# Altium footprint library Wurth_Elektronik_Electromechanic_Wire_to_Board_Connectors_rev16a.PCBLIB: 662 footprints (part 17 of 42)
Each footprint in its own frame and in the unit in brackets; x right, y up, seen from the top. Pads: shape width x height; smd on the part's side, far side on the other; paste and mask are expansions set on the pad; w line width, h text height; cw(c..) or ccw(c..) is an arc to the next point about the centre after c.
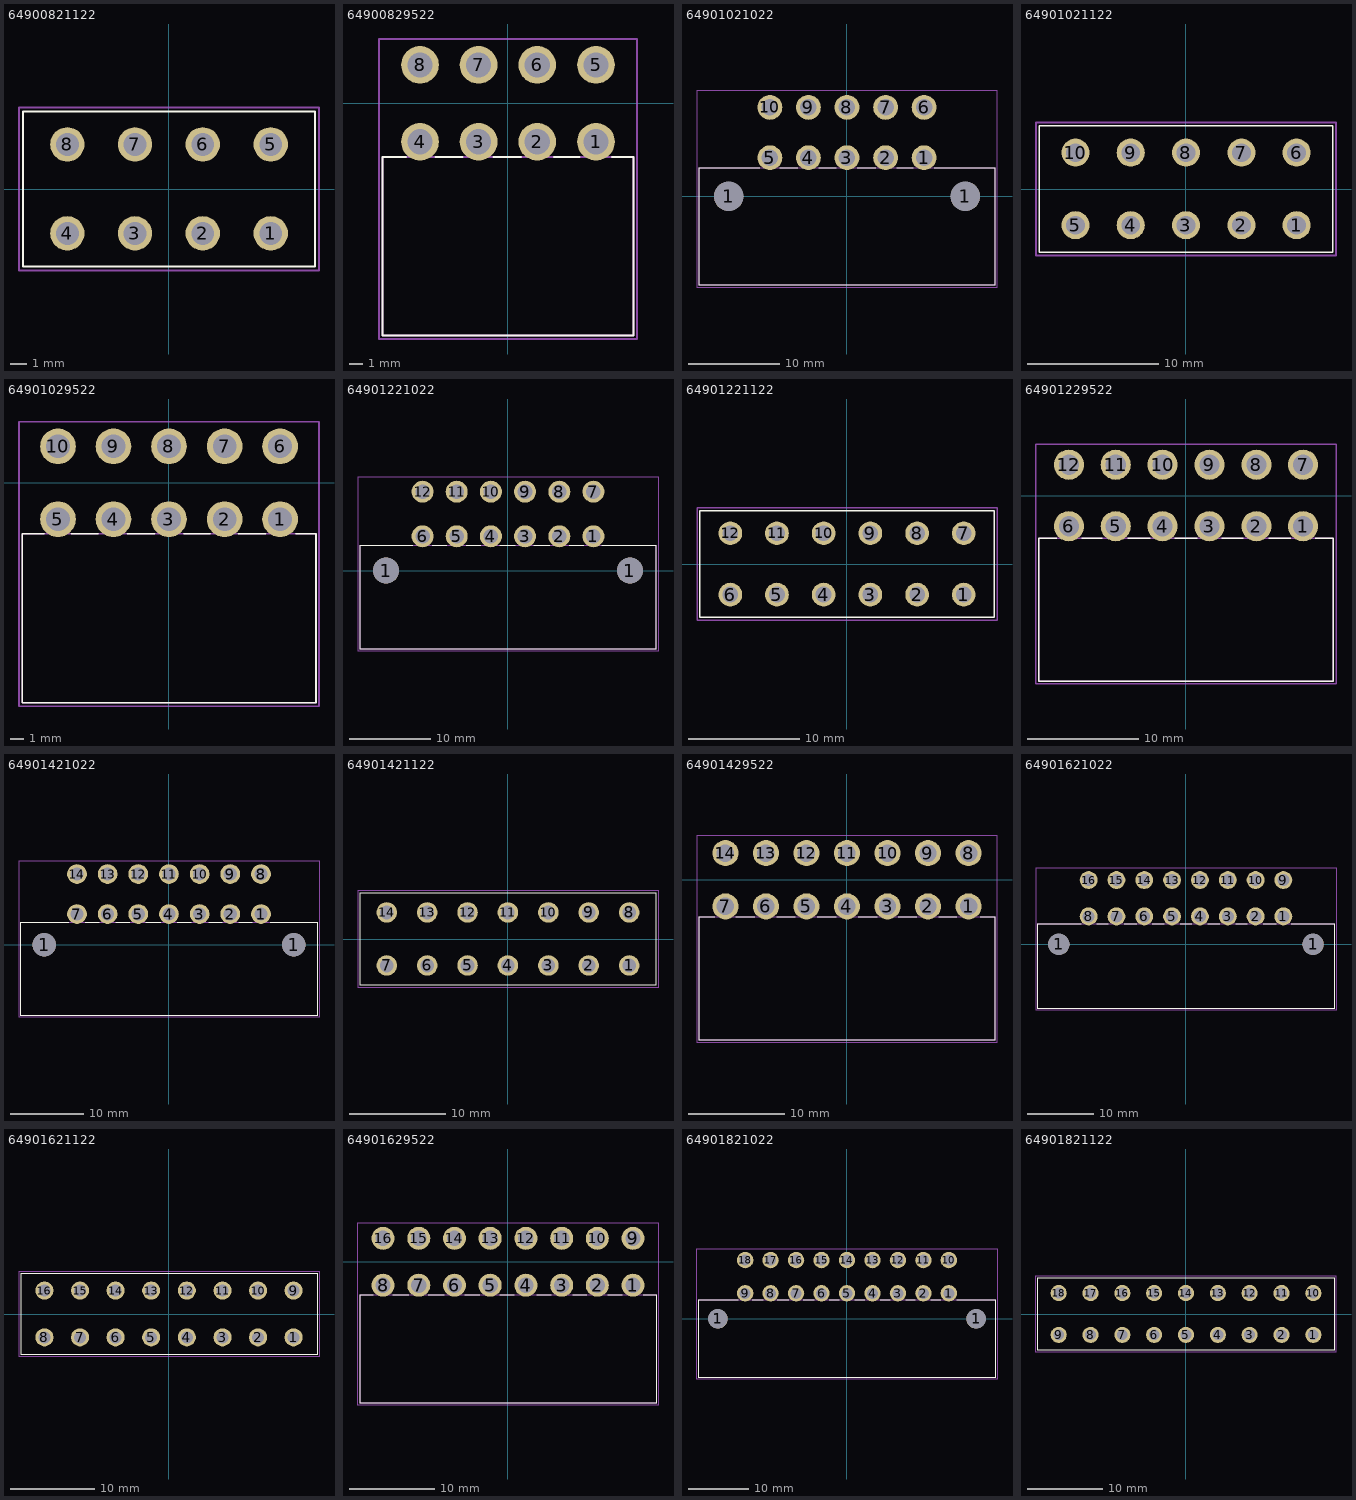
[diagram p16: the footprints below, top view; thin cyan lines are the x and y axes]

## 64900821122 [mil]
pads (8):
  round 84 hole 56: 1(249,-108.27) 2(83,-108.27) 3(-82.68,-108.27) 4(-248.03,-108.27) 5(249,109) 6(83,109) 7(-82.68,109) 8(-248.03,109)
Top Overlay:
  lines w5: -356.3,-188.98 357,-188.98 357,189 -356.3,189 -356.3,-188.98
Mechanical 2:
  text ">NAME" at -108.27,237 h77.5
Mechanical 4:
  text ">VALUE" at -127.95,-285.43 h77.5
Mechanical 16:
  text "1" at 224,-125 h77.5
  text "8" at -267.32,85 h77.5
Mechanical 27:
  lines w5: -366.14,-198.82 367,-198.82 367,199 -366.14,199 -366.14,-198.82

## 64900829522 [mil]
pads (8):
  round 106.5 hole 71: 1(249,-108.27) 2(83,-108.27) 3(-82.68,-108.27) 4(-248.03,-108.27) 5(249,109) 6(83,109) 7(-82.68,109) 8(-248.03,109)
Top Overlay:
  lines w5: -287.4,-151.57 -354.33,-151.57 -354.33,-655.51 355,-655.51 355,-153.54 355,-151.57 294,-151.57 ; -204.72,-151.57 -127.95,-151.57 ; -41.34,-151.57 38,-151.57 ; 130,-151.57 203,-151.57
Mechanical 2:
  text ">NAME" at -638.68,-358.86 h77.5
Mechanical 4:
  text ">VALUE" at -663.68,-438.29 h77.5
Mechanical 16:
  lines w5: -354.33,-655.51 355,-655.51 355,-151.57 -354.33,-151.57 -354.33,-655.51
  text "8" at -260.24,75 h77.5
  text "1" at 247,-133.86 h77.5
Mechanical 27:
  lines w5: -364.17,-665.35 365,-665.35 365,182 -364.17,182 -364.17,-665.35

## 64901021022 [mil]
pads (12):
  round 126 hole 126: 1(-507.87,0) 1(508,0)
  round 106.5 hole 71: 1(331,166) 2(166,166) 3(0,166) 4(-165.35,166) 5(-330.71,166) 6(331,382) 7(166,382) 8(0,382) 9(-165.35,382) 10(-330.71,382)
Top Overlay:
  lines w5: -374.02,123 -633.86,123 -633.86,-381.89 634,-381.89 634,123 375,123 ; -289.37,123 -210.63,123 ; -122.05,123 -45.28,123 ; 44,123 121,123 121,121 ; 213,123 284,123
Mechanical 2:
  text ">NAME" at -921.36,-110.24 h77.5
Mechanical 4:
  text ">VALUE" at -946.36,-189.67 h77.5
Mechanical 16:
  lines w5: -633.86,-381.89 634,-381.89 634,123 -633.86,123 -633.86,-381.89
  text "1" at 365,121 h77.5
  text "10" at -377.56,349 h77.5
Mechanical 27:
  lines w5: -643.7,-391.73 644,-391.73 644,455 -643.7,455 -643.7,-391.73

## 64901021122 [mil]
pads (10):
  round 84 hole 56: 1(331,-108.27) 2(166,-108.27) 3(0,-108.27) 4(-165.35,-108.27) 5(-330.71,-108.27) 6(331,109) 7(166,109) 8(0,109) 9(-165.35,109) 10(-330.71,109)
Top Overlay:
  lines w5: -438.98,-188.98 439,-188.98 439,189 -438.98,189 -438.98,-188.98
Mechanical 2:
  text ">NAME" at -108.27,237 h77.5
Mechanical 4:
  text ">VALUE" at -127.95,-285.43 h77.5
Mechanical 16:
  text "1" at 306,-125 h77.5
  text "10" at -384.65,85 h77.5
Mechanical 27:
  lines w5: -448.82,-198.82 449,-198.82 449,199 -448.82,199 -448.82,-198.82

## 64901029522 [mil]
pads (10):
  round 106.5 hole 71: 1(331,-108.27) 2(166,-108.27) 3(0,-108.27) 4(-165.35,-108.27) 5(-330.71,-108.27) 6(331,109) 7(166,109) 8(0,109) 9(-165.35,109) 10(-330.71,109)
Top Overlay:
  lines w5: -372.05,-151.57 -437.01,-151.57 -437.01,-655.51 438,-655.51 438,-151.57 ; -291.34,-151.57 -210.63,-151.57 ; -124.02,-151.57 -43.31,-151.57 ; 44,-151.57 123,-151.57 ; 207,-151.57 288,-151.57 ; 378,-151.57 436,-151.57
Mechanical 2:
  text ">NAME" at -721.36,-358.86 h77.5
Mechanical 4:
  text ">VALUE" at -746.36,-438.29 h77.5
Mechanical 16:
  lines w5: -437.01,-655.51 438,-655.51 438,-151.57 -437.01,-151.57 -437.01,-655.51
  text "10" at -377.56,75 h77.5
  text "1" at 322,-133.86 h77.5
Mechanical 27:
  lines w5: -446.85,-665.35 447,-665.35 447,182 -446.85,182 -446.85,-665.35

## 64901221022 [mil]
pads (14):
  round 126 hole 126: 1(-590.55,0) 1(591,0)
  round 106.5 hole 71: 1(414,166) 2(249,166) 3(83,166) 4(-82.68,166) 5(-248.03,166) 6(-413.39,166) 7(414,382) 8(249,382) 9(83,382) 10(-82.68,382) 11(-248.03,382) 12(-413.39,382)
Top Overlay:
  lines w5: -460.63,123 -716.54,123 -716.54,-381.89 717,-381.89 717,123 455,123 ; -366.14,123 -295.28,123 ; -202.76,123 -131.89,123 ; -39.37,123 36,123 ; 126,123 203,123 ; 296,123 367,123
Mechanical 2:
  text ">NAME" at -1051.08,-109.65 h77.5
Mechanical 4:
  text ">VALUE" at -1055.02,-194.98 h77.5
Mechanical 16:
  lines w5: -716.54,-381.89 717,-381.89 717,123 -716.54,123 -716.54,-381.89
  text "1" at 389,24 h77.5
  text "12" at -444.88,349 h77.5
Mechanical 27:
  lines w5: -726.38,-391.73 727,-391.73 727,455 -726.38,455 -726.38,-391.73

## 64901221122 [mil]
pads (12):
  round 84 hole 56: 1(414,-108.27) 2(249,-108.27) 3(83,-108.27) 4(-82.68,-108.27) 5(-248.03,-108.27) 6(-413.39,-108.27) 7(414,109) 8(249,109) 9(83,109) 10(-82.68,109) 11(-248.03,109) 12(-413.39,109)
Top Overlay:
  lines w5: -521.65,-188.98 522,-188.98 522,189 -521.65,189 -521.65,-188.98
Mechanical 2:
  text ">NAME" at -108.27,237 h77.5
Mechanical 4:
  text ">VALUE" at -127.95,-285.43 h77.5
Mechanical 16:
  text "1" at 389,-125 h77.5
  text "12" at -451.97,85 h77.5
Mechanical 27:
  lines w5: -531.5,-198.82 532,-198.82 532,199 -531.5,199 -531.5,-198.82

## 64901229522 [mil]
pads (12):
  round 106.5 hole 71: 1(414,-108.27) 2(249,-108.27) 3(83,-108.27) 4(-82.68,-108.27) 5(-248.03,-108.27) 6(-413.39,-108.27) 7(414,109) 8(249,109) 9(83,109) 10(-82.68,109) 11(-248.03,109) 12(-413.39,109)
Top Overlay:
  lines w5: -456.69,-151.57 -519.68,-151.57 -519.68,-655.51 520,-655.51 520,-151.57 457,-151.57 ; -368.11,-151.57 -295.28,-151.57 ; -204.72,-151.57 -125.98,-151.57 ; -39.37,-151.57 40,-151.57 ; 126,-151.57 203,-151.57 ; 292,-151.57 371,-151.57
Mechanical 2:
  text ">NAME" at -813.68,-383.86 h77.5
Mechanical 4:
  text ">VALUE" at -838.68,-463.29 h77.5
Mechanical 16:
  lines w5: -519.68,-655.51 520,-655.51 520,-151.57 -519.68,-151.57 -519.68,-655.51
  text "12" at -444.88,75 h77.5
  text "1" at 405,-133.86 h77.5
Mechanical 27:
  lines w5: -529.53,-665.35 530,-665.35 530,182 -529.53,182 -529.53,-665.35

## 64901421022 [mil]
pads (16):
  round 126 hole 126: 1(-673.23,0) 1(674,0)
  round 106.5 hole 71: 1(497,166) 2(331,166) 3(166,166) 4(0,166) 5(-165.35,166) 6(-330.71,166) 7(-496.06,166) 8(497,382) 9(331,382) 10(166,382) 11(0,382) 12(-165.35,382) 13(-330.71,382) 14(-496.06,382)
Top Overlay:
  lines w5: -539.37,123 -799.21,123 -799.21,-381.89 800,-381.89 800,123 546,123 ; -452.76,123 -375.98,123 ; -287.4,123 -212.6,123 ; -125.98,123 -43.31,123 ; 46,123 121,123 ; 215,123 288,123 ; 376,123 449,123
Mechanical 2:
  text ">NAME" at -1106,-135.24 h77.5
Mechanical 4:
  text ">VALUE" at -1106,-214.67 h77.5
Mechanical 16:
  lines w5: -799.21,-381.89 800,-381.89 800,123 -799.21,123 -799.21,-381.89
  text "14" at -537.2,349 h77.5
  text "1" at 472,24 h77.5
Mechanical 27:
  lines w5: -809.06,-391.73 810,-391.73 810,455 -809.06,455 -809.06,-391.73

## 64901421122 [mil]
pads (14):
  round 84 hole 56: 1(497,-108.27) 2(331,-108.27) 3(166,-108.27) 4(0,-108.27) 5(-165.35,-108.27) 6(-330.71,-108.27) 7(-496.06,-108.27) 8(497,109) 9(331,109) 10(166,109) 11(0,109) 12(-165.35,109) 13(-330.71,109) 14(-496.06,109)
Top Overlay:
  lines w5: -604.33,-188.98 605,-188.98 605,189 -604.33,189 -604.33,-188.98
Mechanical 2:
  text ">NAME" at -108.27,237 h77.5
Mechanical 4:
  text ">VALUE" at -127.95,-285.43 h77.5
Mechanical 16:
  text "1" at 472,-125 h77.5
  text "14" at -544.29,85 h77.5
Mechanical 27:
  lines w5: -614.17,-198.82 615,-198.82 615,199 -614.17,199 -614.17,-198.82

## 64901429522 [mil]
pads (14):
  round 106.5 hole 71: 1(497,-108.27) 2(331,-108.27) 3(166,-108.27) 4(0,-108.27) 5(-165.35,-108.27) 6(-330.71,-108.27) 7(-496.06,-108.27) 8(497,109) 9(331,109) 10(166,109) 11(0,109) 12(-165.35,109) 13(-330.71,109) 14(-496.06,109)
Top Overlay:
  lines w5: -539.37,-151.57 -602.36,-151.57 -602.36,-655.51 603,-655.51 603,-153.54 603,-151.57 544,-151.57 ; -454.72,-151.57 -375.98,-151.57 ; -287.4,-151.57 -210.63,-151.57 ; -122.05,-151.57 -43.31,-151.57 ; 46,-151.57 123,-151.57 ; 209,-151.57 286,-151.57 ; 375,-151.57 449,-151.57
Mechanical 2:
  text ">NAME" at -881,-408.86 h77.5
Mechanical 4:
  text ">VALUE" at -906,-488.29 h77.5
Mechanical 16:
  lines w5: -602.36,-655.51 603,-655.51 603,-151.57 -602.36,-151.57 -602.36,-655.51
  text "14" at -537.2,75 h77.5
  text "1" at 487,-133.86 h77.5
Mechanical 27:
  lines w5: -612.2,-665.35 613,-665.35 613,182 -612.2,182 -612.2,-665.35

## 64901621022 [mil]
pads (18):
  round 126 hole 126: 1(-755.91,0) 1(756,0)
  round 106.5 hole 71: 1(579,166) 2(414,166) 3(249,166) 4(83,166) 5(-82.68,166) 6(-248.03,166) 7(-413.39,166) 8(-578.74,166) 9(579,382) 10(414,382) 11(249,382) 12(83,382) 13(-82.68,382) 14(-248.03,382) 15(-413.39,382) 16(-578.74,382)
Top Overlay:
  lines w5: -622.05,123 -881.89,123 -881.89,-381.89 882,-381.89 882,123 ; -531.5,123 -462.6,123 ; -368.11,123 -291.34,123 ; -200.79,123 -127.95,123 ; -33.46,123 34,123 ; 130,123 201,123 ; 296,123 365,123 ; 459,123 536,123 ; 626,123 880,123
Mechanical 2:
  text ">NAME" at -1198.33,-135.24 h77.5
Mechanical 4:
  text ">VALUE" at -1223.33,-239.67 h77.5
Mechanical 16:
  lines w5: -881.89,-381.89 882,-381.89 882,123 -881.89,123 -881.89,-381.89
  text "16" at -629.53,349 h77.5
  text "1" at 562,146 h77.5
Mechanical 27:
  lines w5: -891.73,-391.73 892,-391.73 892,455 -891.73,455 -891.73,-391.73

## 64901621122 [mil]
pads (16):
  round 84 hole 56: 1(579,-108.27) 2(414,-108.27) 3(249,-108.27) 4(83,-108.27) 5(-82.68,-108.27) 6(-248.03,-108.27) 7(-413.39,-108.27) 8(-578.74,-108.27) 9(579,109) 10(414,109) 11(249,109) 12(83,109) 13(-82.68,109) 14(-248.03,109) 15(-413.39,109) 16(-578.74,109)
Top Overlay:
  lines w5: -687.01,-188.98 688,-188.98 688,189 -687.01,189 -687.01,-188.98
Mechanical 2:
  text ">NAME" at -108.27,237 h77.5
Mechanical 4:
  text ">VALUE" at -127.95,-285.43 h77.5
Mechanical 16:
  text "1" at 554,-125 h77.5
  text "16" at -611.61,85 h77.5
Mechanical 27:
  lines w5: -696.85,-198.82 697,-198.82 697,199 -696.85,199 -696.85,-198.82

## 64901629522 [mil]
pads (16):
  round 106.5 hole 71: 1(579,-108.27) 2(414,-108.27) 3(249,-108.27) 4(83,-108.27) 5(-82.68,-108.27) 6(-248.03,-108.27) 7(-413.39,-108.27) 8(-578.74,-108.27) 9(579,109) 10(414,109) 11(249,109) 12(83,109) 13(-82.68,109) 14(-248.03,109) 15(-413.39,109) 16(-578.74,109)
Top Overlay:
  lines w5: -624.02,-151.57 -685.04,-151.57 -685.04,-655.51 686,-655.51 686,-151.57 626,-151.57 ; -533.46,-151.57 -460.63,-151.57 ; -370.08,-151.57 -295.28,-151.57 ; -200.79,-151.57 -131.89,-151.57 ; -37.4,-151.57 30,-151.57 ; 134,-151.57 201,-151.57 ; 300,-151.57 365,-151.57 ; 463,-151.57 530,-151.57
Mechanical 2:
  text ">NAME" at -973.33,-408.86 h77.5
Mechanical 4:
  text ">VALUE" at -998.33,-488.29 h77.5
Mechanical 16:
  lines w5: -685.04,-655.51 686,-655.51 686,-151.57 -685.04,-151.57 -685.04,-655.51
  text "16" at -629.53,75 h77.5
  text "1" at 570,-133.86 h77.5
Mechanical 27:
  lines w5: -694.88,-665.35 695,-665.35 695,182 -694.88,182 -694.88,-665.35

## 64901821022 [mil]
pads (20):
  round 126 hole 126: 1(-838.58,0) 1(839,0)
  round 106.5 hole 71: 1(662,166) 2(497,166) 3(331,166) 4(166,166) 5(0,166) 6(-165.35,166) 7(-330.71,166) 8(-496.06,166) 9(-661.42,166) 10(662,382) 11(497,382) 12(331,382) 13(166,382) 14(0,382) 15(-165.35,382) 16(-330.71,382) 17(-496.06,382) 18(-661.42,382)
Top Overlay:
  lines w5: -964.57,123 -964.57,-381.89 965,-381.89 965,123 ; -962.6,123 -706.69,123 ; -616.14,123 -545.28,123 ; -452.76,123 -377.95,123 ; -283.46,123 -212.6,123 ; -116.14,123 -49.21,123 ; 50,123 117,123 ; 215,123 282,123 ; 382,123 443,123 ; 546,123 611,123 ; 713,123 963,123
Mechanical 2:
  text ">NAME" at -1240.65,-110.24 h77.5
Mechanical 4:
  text ">VALUE" at -1265.65,-189.67 h77.5
Mechanical 16:
  lines w5: -964.57,-381.89 965,-381.89 965,123 -964.57,123 -964.57,-381.89
  text "18" at -721.85,349 h77.5
  text "1" at 639,158 h77.5
Mechanical 27:
  lines w5: -974.41,-391.73 975,-391.73 975,455 -974.41,455 -974.41,-391.73

## 64901821122 [mil]
pads (18):
  round 84 hole 56: 1(662,-108.27) 2(497,-108.27) 3(331,-108.27) 4(166,-108.27) 5(0,-108.27) 6(-165.35,-108.27) 7(-330.71,-108.27) 8(-496.06,-108.27) 9(-661.42,-108.27) 10(662,109) 11(497,109) 12(331,109) 13(166,109) 14(0,109) 15(-165.35,109) 16(-330.71,109) 17(-496.06,109) 18(-661.42,109)
Top Overlay:
  lines w5: -769.68,-188.98 770,-188.98 770,189 -769.68,189 -769.68,-188.98
Mechanical 2:
  text ">NAME" at -108.27,237 h77.5
Mechanical 4:
  text ">VALUE" at -127.95,-285.43 h77.5
Mechanical 16:
  text "1" at 637,-125 h77.5
  text "18" at -713.58,75 h77.5
Mechanical 27:
  lines w5: -779.53,-198.82 780,-198.82 780,199 -779.53,199 -779.53,-198.82